# Altium footprint library microbuilder.PCBLIB: 422 footprints (part 26 of 27)
Each footprint in its own frame and in the unit in brackets; x right, y up, seen from the top. Pads: shape width x height; smd on the part's side, far side on the other; paste and mask are expansions set on the pad; w line width, h text height; cw(c..) or ccw(c..) is an arc to the next point about the centre after c.
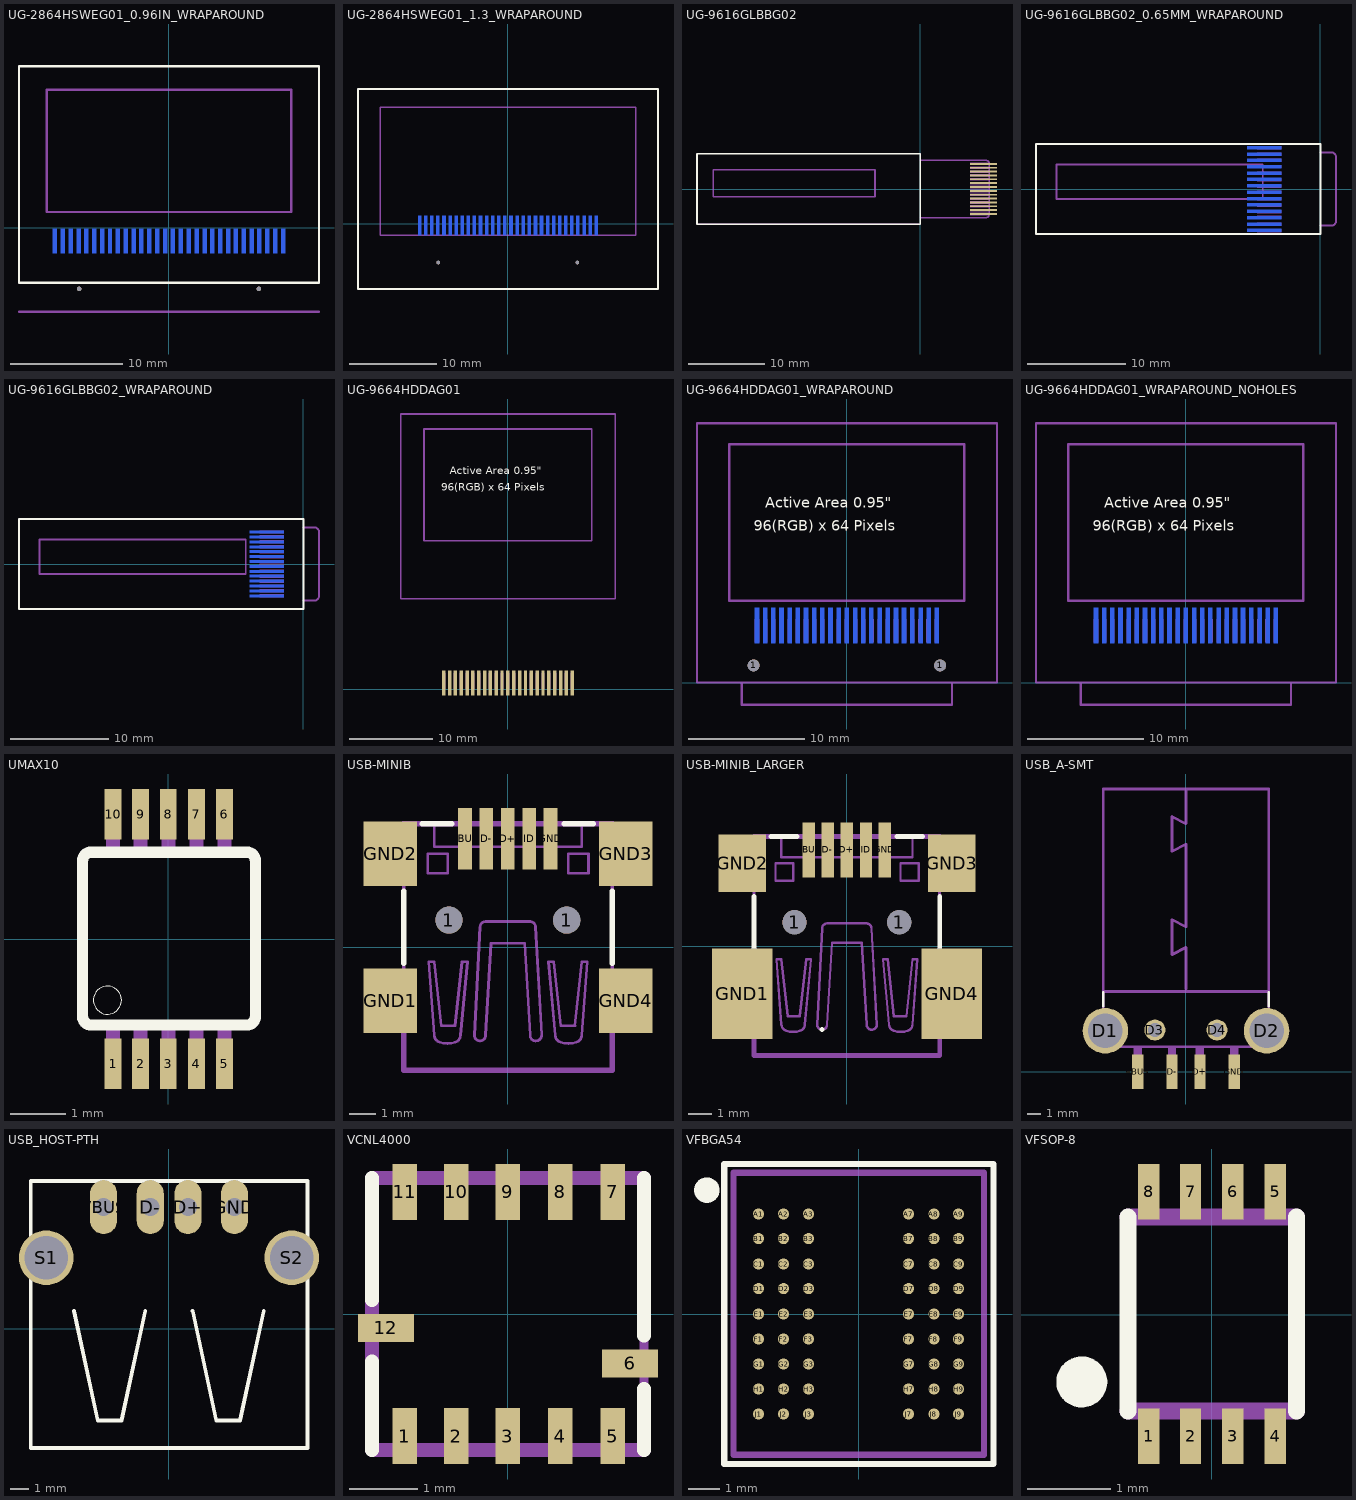
[diagram p25: the footprints below, top view; thin cyan lines are the x and y axes]

## UG-2864HSWEG01_0.96IN_WRAPAROUND [mil]
pads (32):
  rect 14x87 smd far side: 1(-399.61,-47.24) 2(-372.05,-47.24) 3(-344.49,-47.24) 4(-316.93,-47.24) 5(-289.37,-47.24) 6(-261.81,-47.24) 7(-234.25,-47.24) 8(-206.69,-47.24) 9(-179.13,-47.24) 10(-151.57,-47.24) 11(-124.02,-47.24) 12(-96.46,-47.24) 13(-68.9,-47.24) 14(-41.34,-47.24) 15(-13.78,-47.24) 16(14,-47.24) 17(42,-47.24) 18(69,-47.24) 19(97,-47.24) 20(125,-47.24) 21(152,-47.24) 22(180,-47.24) 23(207,-47.24) 24(235,-47.24) 25(262,-47.24) 26(290,-47.24) 27(317,-47.24) 28(345,-47.24) 29(373,-47.24) 30(400,-47.24)
  round 16 hole 16: 1(-314.96,-214.57) 1(315,-214.57)
Top Overlay:
  lines w8: -525.71,566 526,566 526,-192.91 -525.59,-192.91 -525.71,566
Mechanical 16:
  lines w8: -525.59,-295.28 526,-295.28 ; -428.03,55 429,55 429,483 -428.03,483 -428.03,55
  text "PCB EDGE (1.6mm)" at -204.72,-275.59 h49.6
Mechanical 30:
  text "1" at -391.73,21 h27.2
  text "10" at -143.7,17 h27.2
  text "20" at 130,17 h27.2
  text "30" at 412,17 h27.2

## UG-2864HSWEG01_1.3_WRAPAROUND [mil]
pads (32):
  rect 14x87 smd far side: 1(-399.61,-7.87) 2(-372.05,-7.87) 3(-344.49,-7.87) 4(-316.93,-7.87) 5(-289.37,-7.87) 6(-261.81,-7.87) 7(-234.25,-7.87) 8(-206.69,-7.87) 9(-179.13,-7.87) 10(-151.57,-7.87) 11(-124.02,-7.87) 12(-96.46,-7.87) 13(-68.9,-7.87) 14(-41.34,-7.87) 15(-13.78,-7.87) 16(14,-7.87) 17(42,-7.87) 18(69,-7.87) 19(97,-7.87) 20(125,-7.87) 21(152,-7.87) 22(180,-7.87) 23(207,-7.87) 24(235,-7.87) 25(262,-7.87) 26(290,-7.87) 27(317,-7.87) 28(345,-7.87) 29(373,-7.87) 30(400,-7.87)
  round 16 hole 16: 1(-314.96,-175.2) 1(315,-175.2)
Top Overlay:
  lines w8: -679.13,-295.28 680,-295.28 680,611 -679.13,611 -679.13,-295.28
Mechanical 16:
  lines w8: -578.74,-51.18 579,-51.18 579,528 -578.74,528 -578.74,-51.18
  text "PCB EDGE" at -102.36,-275.59 h49.6
Mechanical 30:
  text "1" at -391.73,60 h27.2
  text "10" at -143.7,56 h27.2
  text "20" at 130,56 h27.2
  text "30" at 412,56 h27.2

## UG-9616GLBBG02 [mil]
pads (14):
  rect 138x10 smd: 1(325,-127.95) 2(325,-108.27) 3(325,-88.58) 4(325,-68.9) 5(325,-49.21) 6(325,-29.53) 7(325,-9.84) 8(325,10) 9(325,30) 10(325,50) 11(325,69) 12(325,89) 13(325,109) 14(325,128)
Top Overlay:
  lines w8: -1145.67,-181.1 -1145.67,182 0,182 0,-181.1 -1145.67,-181.1
Mechanical 16:
  rectangle: 256,122 355,135
  rectangle: 256,102 355,116
  rectangle: 256,82 355,96
  rectangle: 256,63 355,76
  rectangle: 256,43 355,57
  rectangle: 256,23 355,37
  rectangle: 256,3 355,17
  rectangle: 256,-16.73 355,-2.95
  rectangle: 256,-36.42 355,-22.64
  rectangle: 256,-56.1 355,-42.32
  rectangle: 256,-75.79 355,-62.01
  rectangle: 256,-95.47 355,-81.69
  rectangle: 256,-115.16 355,-101.38
  rectangle: 256,-134.84 355,-121.06
  lines w5: -1145.67,-181.1 0,-181.1 0,182 -1145.67,182 -1145.67,-181.1
  lines w8: 0,-147.64 335,-147.64 ccw(c335.16,-127.8) 355,-127.95 355,128 ccw(c335,128) 335,148 0,148 ; -1062.99,-39.53 -232.13,-39.53 -232.13,99 -1062.99,99 -1062.99,-39.53
  text "Active Area 0.84\"" at -866.14,40 h49.6
  text "96x16 Pixels" at -807.09,0 h49.6
  text "1" at 217,-137.8 h49.6
  text "14" at 197,99 h49.6

## UG-9616GLBBG02_0.65MM_WRAPAROUND [mil]
pads (14):
  rect 138x12 smd far side: 1(-226.38,-166.34) 2(-226.38,-140.75) 3(-226.38,-115.16) 4(-226.38,-89.57) 5(-226.38,-63.98) 6(-226.38,-38.39) 7(-226.38,-12.8) 8(-226.38,13) 9(-226.38,39) 10(-226.38,64) 11(-226.38,90) 12(-226.38,141) 13(-226.38,116) 14(-226.38,167)
Top Overlay:
  lines w8: -1145.67,-181.1 -1145.67,182 0,182 0,-181.1 -1145.67,-181.1
Mechanical 16:
  rectangle: -255.91,159 -157.48,173
  rectangle: -255.91,133 -157.48,147
  rectangle: -255.91,110 -157.48,124
  rectangle: -255.91,84 -157.48,98
  rectangle: -255.91,57 -157.48,70
  rectangle: -255.91,31 -157.48,45
  rectangle: -255.91,5 -157.48,19
  rectangle: -255.91,-18.7 -157.48,-4.92
  rectangle: -255.91,-46.26 -157.48,-32.48
  rectangle: -255.91,-71.85 -157.48,-58.07
  rectangle: -255.91,-97.44 -157.48,-83.66
  rectangle: -255.91,-121.06 -157.48,-107.28
  rectangle: -255.91,-148.62 -157.48,-134.84
  rectangle: -255.91,-174.21 -157.48,-160.43
  lines w5: -1145.67,-181.1 0,-181.1 0,-147.64 0,148 0,182 -1145.67,182 -1145.67,-181.1
  lines w8: 0,-147.64 44,-147.64 ccw(c43.66,-128.3) 63,-127.95 63,128 ccw(c43.5,128.5) 44,148 0,148 ; -1062.99,-39.53 -232.13,-39.53 -232.13,99 -1062.99,99 -1062.99,-39.53
  text "Active Area 0.84\"" at -866.14,40 h49.6
  text "96x16 Pixels" at -807.09,0 h49.6
  text "1" at -334.65,-167.17 h49.6
  text "14" at -354.33,138 h49.6

## UG-9616GLBBG02_WRAPAROUND [mil]
pads (14):
  rect 138x10 smd far side: 1(-147.64,-127.95) 2(-147.64,-108.27) 3(-147.64,-88.58) 4(-147.64,-68.9) 5(-147.64,-49.21) 6(-147.64,-29.53) 7(-147.64,-9.84) 8(-147.64,10) 9(-147.64,30) 10(-147.64,50) 11(-147.64,69) 12(-147.64,89) 13(-147.64,109) 14(-147.64,128)
Top Overlay:
  lines w8: -1145.67,-181.1 -1145.67,182 0,182 0,-181.1 -1145.67,-181.1
Mechanical 16:
  rectangle: -177.17,122 -78.74,135
  rectangle: -177.17,102 -78.74,116
  rectangle: -177.17,82 -78.74,96
  rectangle: -177.17,63 -78.74,76
  rectangle: -177.17,43 -78.74,57
  rectangle: -177.17,23 -78.74,37
  rectangle: -177.17,3 -78.74,17
  rectangle: -177.17,-16.73 -78.74,-2.95
  rectangle: -177.17,-36.42 -78.74,-22.64
  rectangle: -177.17,-56.1 -78.74,-42.32
  rectangle: -177.17,-75.79 -78.74,-62.01
  rectangle: -177.17,-95.47 -78.74,-81.69
  rectangle: -177.17,-115.16 -78.74,-101.38
  rectangle: -177.17,-134.84 -78.74,-121.06
  lines w5: -1145.67,-181.1 0,-181.1 0,-147.64 0,148 0,182 -1145.67,182 -1145.67,-181.1
  lines w8: 0,-147.64 44,-147.64 ccw(c43.66,-128.3) 63,-127.95 63,128 ccw(c43.5,128.5) 44,148 0,148 ; -1062.99,-39.53 -232.13,-39.53 -232.13,99 -1062.99,99 -1062.99,-39.53
  text "Active Area 0.84\"" at -866.14,40 h49.6
  text "96x16 Pixels" at -807.09,0 h49.6
  text "1" at -255.91,-137.8 h49.6
  text "14" at -275.59,99 h49.6

## UG-9664HDDAG01 [mil]
pads (23):
  rect 16x119 smd: 1(-303.15,28) 2(-275.59,28) 3(-248.03,28) 4(-220.47,28) 5(-192.91,28) 6(-165.35,28) 7(-137.8,28) 8(-110.24,28) 9(-82.68,28) 10(-55.12,28) 11(-27.56,28) 12(0,28) 13(28,28) 14(56,28) 15(83,28) 16(111,28) 17(138,28) 18(166,28) 19(193,28) 20(221,28) 21(249,28) 22(276,28) 23(304,28)
Top Overlay:
  text "Active Area 0.95\"" at -275.59,1004 h62
  text "96(RGB) x 64 Pixels" at -314.96,926 h62
Mechanical 1:
  rectangle: -311.02,0 -295.28,79
  rectangle: -283.46,0 -267.72,79
  rectangle: -255.91,0 -240.16,79
  rectangle: -228.35,0 -212.6,79
  rectangle: -200.79,0 -185.04,79
  rectangle: -173.23,0 -157.48,79
  rectangle: -145.67,0 -129.92,79
  rectangle: -118.11,0 -102.36,79
  rectangle: -90.55,0 -74.8,79
  rectangle: -62.99,0 -47.24,79
  rectangle: -35.43,0 -19.68,79
  rectangle: -7.87,0 8,79
  rectangle: 20,0 36,79
  rectangle: 48,0 63,79
  rectangle: 75,0 91,79
  rectangle: 103,0 119,79
  rectangle: 130,0 146,79
  rectangle: 158,0 174,79
  rectangle: 186,0 201,79
  rectangle: 213,0 229,79
  rectangle: 241,0 256,79
  rectangle: 268,0 284,79
  rectangle: 296,0 312,79
Mechanical 16:
  lines w8: -505.91,426 507,426 507,1300 -505.91,1300 -505.91,426 ; -396.46,701 397,701 397,1229 -396.46,1229 -396.46,701
  text "1" at -314.96,119 h62
  text "23" at 276,119 h62
Via Holes:
  rectangle: -393.7,-118.11 394,-39.37
  rectangle: -393.7,95 394,174
  rectangle: -393.7,-39.37 -322.83,95
  rectangle: 323,-39.37 394,95

## UG-9664HDDAG01_WRAPAROUND [mil]
pads (25):
  round 40 hole 40: 1(-314.96,58) 1(315,58)
  rect 14x119 smd far side: 1(-303.15,193) 2(-275.59,193) 3(-248.03,193) 4(-220.47,193) 5(-192.91,193) 6(-165.35,193) 7(-137.8,193) 8(-110.24,193) 9(-82.68,193) 10(-55.12,193) 11(-27.56,193) 12(0,193) 13(28,193) 14(56,193) 15(83,193) 16(111,193) 17(138,193) 18(166,193) 19(193,193) 20(221,193) 21(249,193) 22(276,193) 23(304,193)
Top Overlay:
  text "Active Area 0.95\"" at -275.59,579 h62
  text "96(RGB) x 64 Pixels" at -314.96,500 h62
Mechanical 16:
  rectangle: -311.02,136 -295.28,215
  rectangle: -283.46,136 -267.72,215
  rectangle: -255.91,136 -240.16,215
  rectangle: -228.35,136 -212.6,215
  rectangle: -200.79,136 -185.04,215
  rectangle: -173.23,136 -157.48,215
  rectangle: -145.67,136 -129.92,215
  rectangle: -118.11,136 -102.36,215
  rectangle: -90.55,136 -74.8,215
  rectangle: -62.99,136 -47.24,215
  rectangle: -35.43,136 -19.68,215
  rectangle: -7.87,136 8,215
  rectangle: 20,136 36,215
  rectangle: 48,136 63,215
  rectangle: 75,136 91,215
  rectangle: 103,136 119,215
  rectangle: 130,136 146,215
  rectangle: 158,136 174,215
  rectangle: 186,136 201,215
  rectangle: 213,136 229,215
  rectangle: 241,136 256,215
  rectangle: 268,136 284,215
  rectangle: 296,136 312,215
  lines w8: -354.33,0 -505.91,0 -505.91,875 507,875 507,0 355,0 ; -354.33,0 355,0 ; -354.33,0 -354.33,-74.41 355,-74.41 355,0 ; -396.46,276 397,276 397,804 -396.46,804 -396.46,276
  text "1" at -314.96,284 h62
  text "23" at 276,284 h62
Via Holes:
  rectangle: -393.7,48 394,126
  rectangle: -393.7,260 394,339
  region: -322.83,260 -393.7,260 -393.7,126 -322.83,126
  rectangle: 323,126 394,260

## UG-9664HDDAG01_WRAPAROUND_NOHOLES [mil]
pads (23):
  rect 14x119 smd far side: 1(-303.15,193) 2(-275.59,193) 3(-248.03,193) 4(-220.47,193) 5(-192.91,193) 6(-165.35,193) 7(-137.8,193) 8(-110.24,193) 9(-82.68,193) 10(-55.12,193) 11(-27.56,193) 12(0,193) 13(28,193) 14(56,193) 15(83,193) 16(111,193) 17(138,193) 18(166,193) 19(193,193) 20(221,193) 21(249,193) 22(276,193) 23(304,193)
Top Overlay:
  text "Active Area 0.95\"" at -275.59,579 h62
  text "96(RGB) x 64 Pixels" at -314.96,500 h62
Mechanical 16:
  rectangle: -311.02,136 -295.28,215
  rectangle: -283.46,136 -267.72,215
  rectangle: -255.91,136 -240.16,215
  rectangle: -228.35,136 -212.6,215
  rectangle: -200.79,136 -185.04,215
  rectangle: -173.23,136 -157.48,215
  rectangle: -145.67,136 -129.92,215
  rectangle: -118.11,136 -102.36,215
  rectangle: -90.55,136 -74.8,215
  rectangle: -62.99,136 -47.24,215
  rectangle: -35.43,136 -19.68,215
  rectangle: -7.87,136 8,215
  rectangle: 20,136 36,215
  rectangle: 48,136 63,215
  rectangle: 75,136 91,215
  rectangle: 103,136 119,215
  rectangle: 130,136 146,215
  rectangle: 158,136 174,215
  rectangle: 186,136 201,215
  rectangle: 213,136 229,215
  rectangle: 241,136 256,215
  rectangle: 268,136 284,215
  rectangle: 296,136 312,215
  lines w8: -354.33,0 -505.91,0 -505.91,875 507,875 507,0 355,0 ; -354.33,0 355,0 ; -354.33,0 -354.33,-74.41 355,-74.41 355,0 ; -396.46,276 397,276 397,804 -396.46,804 -396.46,276
  text "1" at -314.96,284 h62
  text "23" at 276,284 h62
Via Holes:
  rectangle: -393.7,48 394,126
  rectangle: -393.7,260 394,339
  region: -322.83,260 -393.7,260 -393.7,126 -322.83,126
  rectangle: 323,126 394,260

## UMAX10 [mil]
pads (10):
  rect 12x36 smd: 1(-39.37,-88.58) 2(-19.68,-88.58) 3(0,-88.58) 4(20,-88.58) 5(40,-88.58) 6(40,89) 7(20,89) 8(0,89) 9(-19.68,89) 10(-39.37,89)
Top Overlay:
  circle w0: c-43.31,-43.31 r10
  lines w8: -61.02,-55.12 ccw(c-55.12,-55.12) -55.12,-61.02 56,-61.02 ccw(c56.05,-55.07) 62,-55.12 62,56 ccw(c56,56) 56,62 -55.12,62 ccw(c-55.07,56.05) -61.02,56 -61.02,-55.12
Mechanical 16:
  rectangle: -44.37,-101 -34.37,-64
  rectangle: -24.68,-101 -14.69,-64
  rectangle: -5,-101 5,-64
  rectangle: 15,-101 25,-64
  rectangle: 35,-101 45,-64
  rectangle: 35,64 45,101
  rectangle: 15,64 25,101
  rectangle: -5,64 5,101
  rectangle: -24.68,64 -14.69,101
  rectangle: -44.37,64 -34.37,101

## USB-MINIB [mil]
pads (11):
  round 40 hole 40: 1(-86.61,40) 1(87,40)
  rect 20x91 smd: D+(0,160) D-(-31.5,160) GND(63,160) ID(32,160) VBUS(-62.99,160)
  rect 79x95 smd: GND1(-173.23,-78.74) GND2(-173.23,138) GND3(174,138) GND4(174,-78.74)
Top Overlay:
  lines w8: -153.54,-23.62 -153.54,83 ; -125.98,182 -82.68,182 ; 83,182 126,182 ; 154,-23.62 154,83
Mechanical 16:
  lines w4: -200,-105.12 -200,-91.34 ccw(c-200,-79.53) -200,-67.72 -200,-51.97 ; -200,113 -200,127 ccw(c-200,139) -200,151 -200,167 ; -199.21,-105.49 -153.94,-105.49 ; -199.21,-51.21 -153.94,-51.21 ; -199.21,113 -153.94,113 ; -199.21,167 -153.94,167 ; -108.27,178 -108.27,148 109,148 109,178 ; -40.88,-138.04 cw(c-40.88,-129.86) -49.05,-129.86 -40.88,30 cw(c-32.33,29.44) -32.7,38 33,38 cw(c32.54,29.54) 41,30 50,-129.86 cw(c41.41,-129.45) 41,-138.04 cw(c41.09,-129.95) 33,-129.86 25,6 -24.54,6 -32.7,-129.86 cw(c-40.87,-129.86) -40.87,-138.04 ; 153,-104.69 199,-104.69 ; 153,-50.42 199,-50.42 ; 153,114 199,114 ; 153,168 199,168 199,154 ccw(c199,142) 199,130 199,115 ; 199,-103.94 199,-88.19 cw(c199,-76.38) 199,-64.57 199,-50.79 ; -118.11,109 -88.58,109 -88.58,138 -118.11,138 -118.11,109 ; -116.5,-21.54 -108.32,-129.86 ccw(c-96.75,-128.98) -100.15,-140.08 ccw(c-88.91,-103.42) -77.67,-140.08 ccw(c-81.06,-128.98) -69.49,-129.86 -59.27,-21.54 -67.45,-21.54 -77.67,-115.56 -98.11,-115.56 -108.32,-21.54 -116.5,-21.54 ; 60,-21.54 70,-129.86 ccw(c81.48,-129.11) 78,-140.08 ccw(c89.5,-102.58) 101,-140.08 ccw(c97.52,-129.11) 109,-129.86 117,-21.54 109,-21.54 99,-115.56 78,-115.56 68,-21.54 60,-21.54 ; 89,109 89,138 119,138 119,109 89,109
  lines w5: -153.54,-50.79 -153.54,111 ; 154,-48.82 154,113
  lines w8: -153.54,-106.3 -153.54,-181.1 154,-181.1 154,-106.3 ; -153.54,168 -153.54,182 154,182 154,170

## USB-MINIB_LARGER [mil]
pads (11):
  round 40 hole 40: 1(-86.61,40) 1(87,40)
  rect 20x91 smd: D+(0,160) D-(-31.5,160) GND(63,160) ID(32,160) VBUS(-62.99,160)
  rect 100x150 smd: GND1(-173.23,-78.74) GND4(174,-78.74)
  rect 79x95 smd: GND2(-173.23,138) GND3(174,138)
Top Overlay:
  lines w8: -153.54,-23.62 -153.54,83 ; -125.98,182 -82.68,182 ; -40.88,-138.04 -40.87,-138.04 ; 83,182 126,182 ; 154,-23.62 154,83
Mechanical 16:
  lines w4: -200,-105.12 -200,-91.34 ccw(c-200,-79.53) -200,-67.72 -200,-51.97 ; -200,113 -200,127 ccw(c-200,139) -200,151 -200,167 ; -199.21,-105.49 -153.94,-105.49 ; -199.21,-51.21 -153.94,-51.21 ; -199.21,113 -153.94,113 ; -199.21,167 -153.94,167 ; -108.27,178 -108.27,148 109,148 109,178 ; -40.88,-138.04 cw(c-40.88,-129.86) -49.05,-129.86 -40.88,30 cw(c-32.33,29.44) -32.7,38 33,38 cw(c32.54,29.54) 41,30 50,-129.86 cw(c41.41,-129.45) 41,-138.04 cw(c41.09,-129.95) 33,-129.86 25,6 -24.54,6 -32.7,-129.86 cw(c-40.87,-129.86) -40.87,-138.04 ; 153,-104.69 199,-104.69 ; 153,-50.42 199,-50.42 ; 153,114 199,114 ; 153,168 199,168 199,154 ccw(c199,142) 199,130 199,115 ; 199,-103.94 199,-88.19 cw(c199,-76.38) 199,-64.57 199,-50.79 ; -118.11,109 -88.58,109 -88.58,138 -118.11,138 -118.11,109 ; -116.5,-21.54 -108.32,-129.86 ccw(c-96.75,-128.98) -100.15,-140.08 ccw(c-88.91,-103.42) -77.67,-140.08 ccw(c-81.06,-128.98) -69.49,-129.86 -59.27,-21.54 -67.45,-21.54 -77.67,-115.56 -98.11,-115.56 -108.32,-21.54 -116.5,-21.54 ; 60,-21.54 70,-129.86 ccw(c81.48,-129.11) 78,-140.08 ccw(c89.5,-102.58) 101,-140.08 ccw(c97.52,-129.11) 109,-129.86 117,-21.54 109,-21.54 99,-115.56 78,-115.56 68,-21.54 60,-21.54 ; 89,109 89,138 119,138 119,109 89,109
  lines w5: -153.54,-50.79 -153.54,111 ; 154,-48.82 154,113
  lines w8: -153.54,-106.3 -153.54,-181.1 154,-181.1 154,-106.3 ; -153.54,168 -153.54,182 154,182 154,170

## USB_A-SMT [mil]
pads (8):
  round 130 hole 99: D1(-230.31,117) D2(231,117)
  round 60 hole 40: D3(-88.58,119) D4(89,119)
  rect 32x99 smd: D+(40,0) D-(-39.37,0) GND(138,0) VBUS(-137.8,0)
Top Overlay:
  lines w8: -236.22,188 -236.22,227 ; 237,188 237,227
Mechanical 16:
  rectangle: -51.18,0 -27.56,71
  rectangle: 28,0 52,71
  rectangle: -149.61,0 -125.98,71
  rectangle: 126,0 150,71
  lines w8: 0,237 0,355 -39.37,335 -39.37,434 0,414 0,650 -39.37,630 -39.37,729 0,709 0,808 ; 237,229 -236.22,229 ; -236.22,229 -236.22,71 237,71 237,808 0,808 ; -236.22,229 -236.22,808 0,808
  text "PCB EDGE" at -118.11,178 h49.6

## USB_HOST-PTH [mil]
pads (6):
  oval 57x114 hole 38: D+(40,257) D-(-39.37,257) GND(138,257) VBUS(-137.8,257)
  round 115 hole 91: S1(-258.66,150) S2(259,150)
Top Overlay:
  lines w8: -200,38 -150,-193.31 -100,-193.31 -50,38 ; 50,38 100,-193.31 150,-193.31 200,38 ; -291.34,-251.18 292,-251.18 292,312 -291.34,312 -291.34,-251.18

## VCNL4000 [mil]
pads (12):
  rect 14x32 smd: 1(-59.06,-69.78) 2(-29.53,-69.78) 3(0,-69.78) 4(30,-69.78) 5(60,-69.78) 7(60,70) 8(30,70) 9(0,70) 10(-29.53,70) 11(-59.06,70)
  rect 32x16 smd: 6(70,-28.15) 12(-69.78,-7.87)
Top Overlay:
  lines w8: -77.76,-77.76 -77.76,-27.07 ; -77.76,8 -77.76,78 ; 78,-77.76 78,-42.81 ; 78,-12.3 78,78
Mechanical 16:
  lines w5: 78,-77.76 78,78
  lines w8: 78,-77.76 -77.76,-77.76 -77.76,78 78,78
Via Holes:
  region: 0,0 10,0 10,10 0,10

## VFBGA54 [mil]
pads (54):
  rrect100% 14x14 smd: A1(-125.98,126) A2(-94.49,126) A3(-62.99,126) A7(63,126) A8(95,126) A9(126,126) B1(-125.98,95) B2(-94.49,95) B3(-62.99,95) B7(63,95) B8(95,95) B9(126,95) C1(-125.98,63) C2(-94.49,63) C3(-62.99,63) C7(63,63) C8(95,63) C9(126,63) D1(-125.98,32) D2(-94.49,32) D3(-62.99,32) D7(63,32) D8(95,32) D9(126,32) E1(-125.98,0) E2(-94.49,0) E3(-62.99,0) E7(63,0) E8(95,0) E9(126,0) F1(-125.98,-31.5) F2(-94.49,-31.5) F3(-62.99,-31.5) F7(63,-31.5) F8(95,-31.5) F9(126,-31.5) G1(-125.98,-62.99) G2(-94.49,-62.99) G3(-62.99,-62.99) G7(63,-62.99) G8(95,-62.99) G9(126,-62.99) H1(-125.98,-94.49) H2(-94.49,-94.49) H3(-62.99,-94.49) H7(63,-94.49) H8(95,-94.49) H9(126,-94.49) J1(-125.98,-125.98) J2(-94.49,-125.98) J3(-62.99,-125.98) J7(63,-125.98) J8(95,-125.98) J9(126,-125.98)
Top Overlay:
  circle w16: c-191.1,156 r8
  lines w8: -169.29,-188.98 -169.29,189 170,189 170,-188.98 -169.29,-188.98
Mechanical 14:
  text "A" at -185.04,119 h24.8
  text "B" at -185.04,87 h24.8
  text "C" at -185.04,56 h24.8
  text "D" at -185.04,24 h24.8
  text "E" at -185.04,-7.87 h24.8
  text "F" at -185.04,-39.37 h24.8
  text "G" at -185.04,-70.87 h24.8
  text "H" at -185.04,-102.36 h24.8
  text "J" at -185.04,-133.86 h24.8
  text "1" at -133.86,197 h24.8
  text "2" at -102.36,197 h24.8
  text "3" at -70.87,197 h24.8
  text "7" at 56,197 h24.8
  text "8" at 87,197 h24.8
  text "9" at 119,197 h24.8
Mechanical 16:
  lines w8: -157.48,-177.17 -157.48,178 158,178 158,-177.17 -157.48,-177.17

## VFSOP-8 [mil]
pads (8):
  rect 10x26 smd: 1(-29.53,-57.09) 2(-9.84,-57.09) 3(10,-57.09) 4(30,-57.09) 5(30,58) 6(10,58) 7(-9.84,58) 8(-29.53,58)
Top Overlay:
  circle w12: c-61.02,-31.5 r6
  lines w8: -39.37,-45.28 -39.37,46 ; 40,-45.28 40,46
Mechanical 16:
  rectangle: -13.78,-61.02 -5.91,-45.28
  rectangle: -33.46,-61.02 -25.59,-45.28
  rectangle: 6,-61.02 14,-45.28
  rectangle: 26,-61.02 34,-45.28
  rectangle: 26,46 34,62
  rectangle: 6,46 14,62
  rectangle: -13.78,46 -5.91,62
  rectangle: -33.46,46 -25.59,62
  lines w5: -39.37,-45.28 -39.37,46 ; 40,-45.28 40,46
  lines w8: -39.37,-45.28 40,-45.28 ; -39.37,46 40,46